# Altium footprint library ST封装.PcbLib: 1336 footprints (part 67 of 109)
Each footprint in its own frame and in the unit in brackets; x right, y up, seen from the top. Pads: shape width x height; smd on the part's side, far side on the other; paste and mask are expansions set on the pad; w line width, h text height; cw(c..) or ccw(c..) is an arc to the next point about the centre after c.
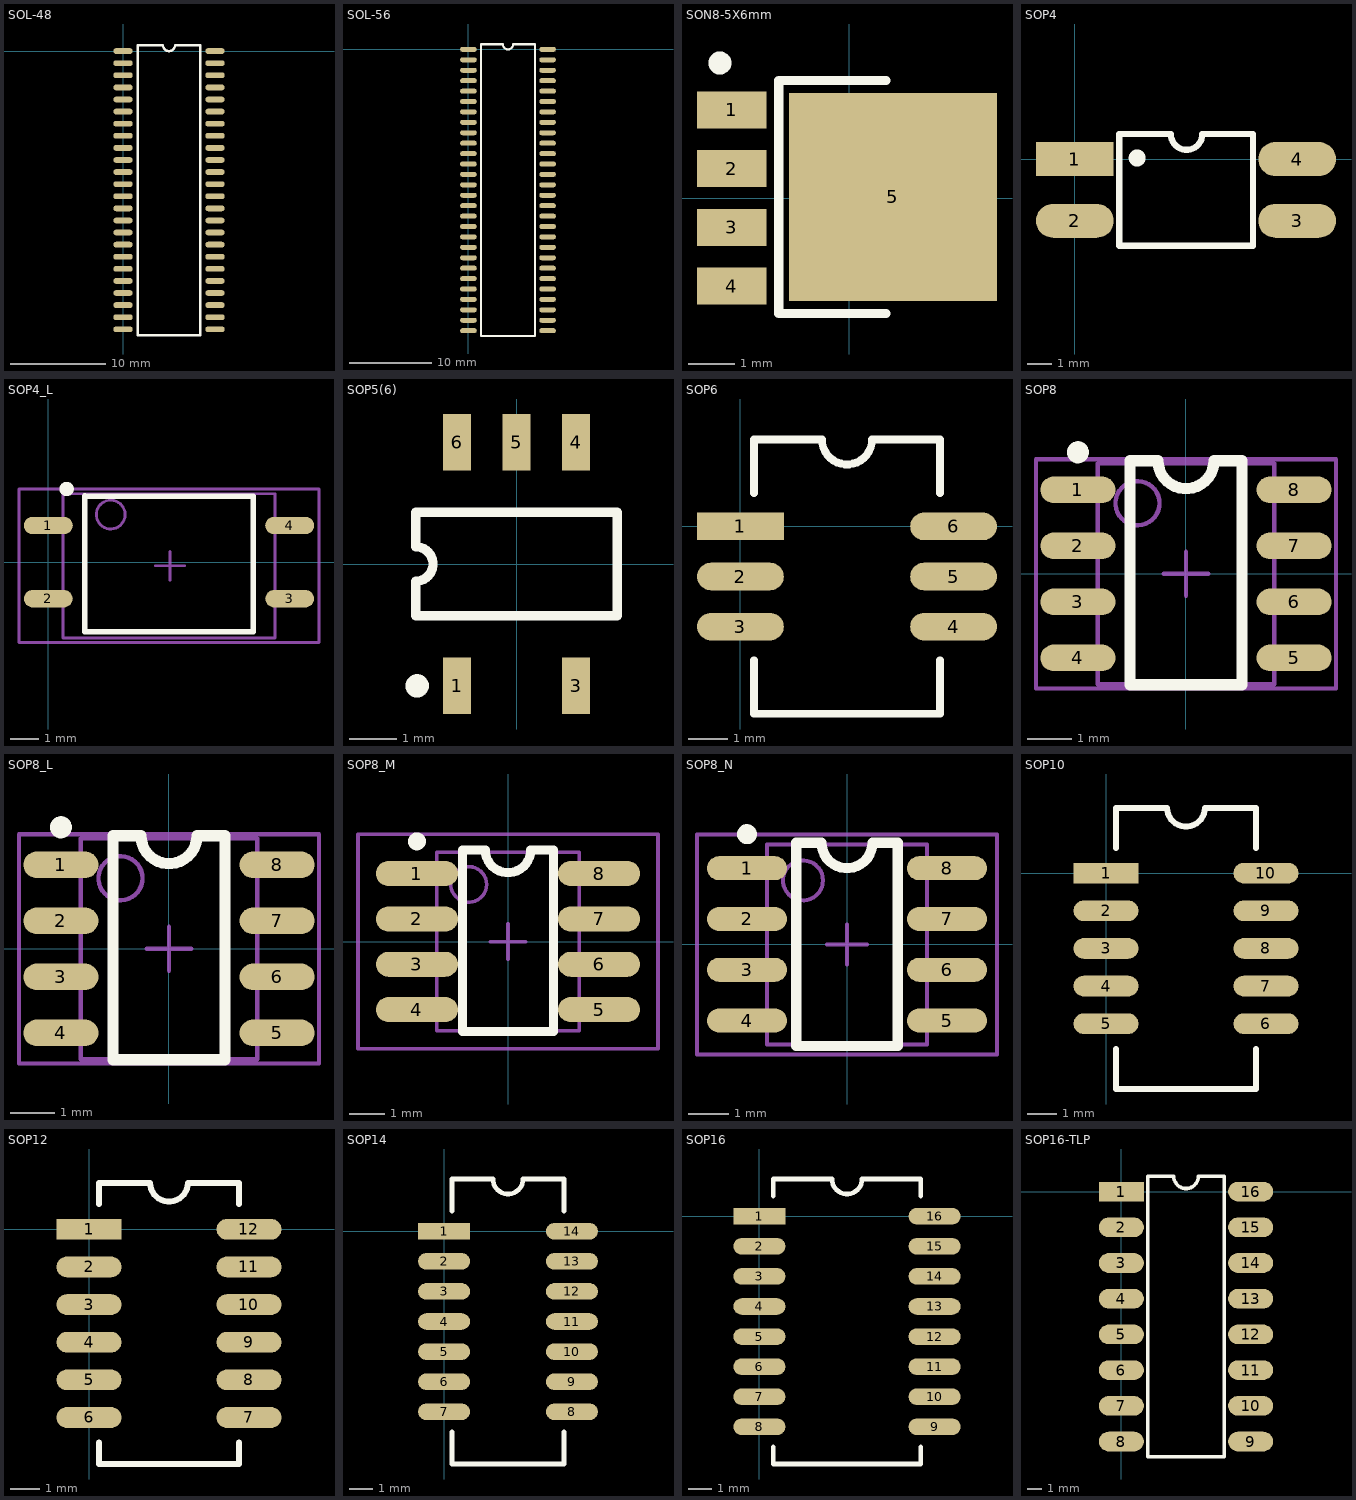
[diagram p66: the footprints below, top view; thin cyan lines are the x and y axes]

## SOL-48 [mil]
pads (48):
  oval 80x24 smd: 1(0,0) 2(0,-50) 3(0,-100) 4(0,-150) 5(0,-200) 6(0,-250) 7(0,-300) 8(0,-350) 9(0,-400) 10(0,-450) 11(0,-500) 12(0,-550) 13(0,-600) 14(0,-650) 15(0,-700) 16(0,-750) 17(0,-800) 18(0,-850) 19(0,-900) 20(0,-950) 21(0,-1000) 22(0,-1050) 23(0,-1100) 24(0,-1150) 25(380,-1150) 26(380,-1100) 27(380,-1050) 28(380,-1000) 29(380,-950) 30(380,-900) 31(380,-850) 32(380,-800) 33(380,-750) 34(380,-700) 35(380,-650) 36(380,-600) 37(380,-550) 38(380,-500) 39(380,-450) 40(380,-400) 41(380,-350) 42(380,-300) 43(380,-250) 44(380,-200) 45(380,-150) 46(380,-100) 47(380,-50) 48(380,0)
Top Overlay:
  lines w10: 60,-1175 320,-1175 320,25 215,25 cw(c190,25) 165,25 60,25 60,-1175

## SOL-56 [mil]
pads (56):
  oval 80x24 smd: 1(0,0) 2(0,-50) 3(0,-100) 4(0,-150) 5(0,-200) 6(0,-250) 7(0,-300) 8(0,-350) 9(0,-400) 10(0,-450) 11(0,-500) 12(0,-550) 13(0,-600) 14(0,-650) 15(0,-700) 16(0,-750) 17(0,-800) 18(0,-850) 19(0,-900) 20(0,-950) 21(0,-1000) 22(0,-1050) 23(0,-1100) 24(0,-1150) 25(0,-1200) 26(0,-1250) 27(0,-1300) 28(0,-1350) 29(380,-1350) 30(380,-1300) 31(380,-1250) 32(380,-1200) 33(380,-1150) 34(380,-1100) 35(380,-1050) 36(380,-1000) 37(380,-950) 38(380,-900) 39(380,-850) 40(380,-800) 41(380,-750) 42(380,-700) 43(380,-650) 44(380,-600) 45(380,-550) 46(380,-500) 47(380,-450) 48(380,-400) 49(380,-350) 50(380,-300) 51(380,-250) 52(380,-200) 53(380,-150) 54(380,-100) 55(380,-50) 56(380,0)
Top Overlay:
  lines w10: 60,-1375 60,25 165,25 ccw(c190,25) 215,25 320,25 320,-1375 60,-1375

## SON8-5X6mm [mm] "8-Pin Small Outline Integrated Circuit 1.27 mm Pitch, IPC Low Density"
height 1.75
pads (5):
  rect 1.5x0.8 smd: 1(-2.54,1.905) 2(-2.54,0.635) 3(-2.54,-0.635) 4(-2.54,-1.905)
  rect 4.5x4.5 smd: 5(0.95,0.025)
Top Overlay:
  circle w0.25: c-2.794,2.921 r0.125
  lines w0.2: 0.8,-2.5 -1.524,-2.5 -1.524,2.54 0.8,2.54
Mechanical 15:
  lines w0.1: -0.5,0 0.5,0 ; 0,-0.5 0,0.5
3D body "User Library-SON8-5x6mm.step": height 1, standoff -0.05, extent -3,-2.5 3,2.5

## SOP4 [mm]
pads (4):
  rect 3.2x1.4 smd: 1(0,0)
  oval 3.2x1.4 smd: 2(0,-2.54) 3(9.15,-2.54) 4(9.15,0)
Top Overlay:
  circle w0.4: c2.564,0.046 r0.15
  lines w0.254: 1.827,-3.57 7.327,-3.57 7.327,1.03 5.247,1.03 cw(c4.599,1.03) 3.95,1.03 1.827,1.03 1.827,-3.57
3D body "SOP-4.STEP": height 2.02, standoff -0.02, extent 1.142,-3.27 8.002,0.73

## SOP4_L [mm] "8-Pin Small Outline Integrated Circuit 1.27 mm Pitch, IPC High Density"
height 1.75
pads (4):
  oval 1.7x0.6 smd: 1(0,1.27) 2(0,-1.27) 3(8.382,-1.27) 4(8.382,1.27)
Top Overlay:
  circle w0.25: c0.637,2.54 r0.125
  lines w0.2: 1.27,2.286 7.112,2.286 7.112,-2.413 1.27,-2.413 1.27,2.3
Mechanical 13:
  circle w0.1: c2.167,1.651 r0.5
  lines w0.1: 0.508,-2.627 7.874,-2.627 7.874,2.373 0.508,2.373 0.508,-2.627
Mechanical 15:
  lines w0.1: 3.728,-0.127 4.728,-0.127 ; 4.228,-0.627 4.228,0.373 ; -1.016,-2.794 9.398,-2.794 9.398,2.54 -1.016,2.54 -1.016,-2.794
3D body "SOP-4.STEP": height 2.02, standoff -0.02, extent 0.761,-2 7.621,2

## SOP5(6) [mm] "Small Outline; 6 Leads (1 Absent); Body Width 4.4 mm; Pitch 1.27 mm"
height 2.4
pads (5):
  rect 0.6x1.2 smd: 1(-1.27,-2.6) 3(1.27,-2.6) 4(1.27,2.6) 5(0,2.6) 6(-1.27,2.6)
Top Overlay:
  circle w0.25: c-2.12,-2.6 r0.125
  lines w0.2: -2.15,-1.1 -2.15,-0.367 ccw(c-2.15,0) -2.15,0.367 -2.15,1.1 2.15,1.1 2.15,-1.1 -2.15,-1.1

## SOP6 [mm]
pads (6):
  rect 2.2x0.7 smd: 1(0,0)
  oval 2.2x0.7 smd: 2(0,-1.27) 3(0,-2.54) 4(5.4,-2.54) 5(5.4,-1.27) 6(5.4,0)
Top Overlay:
  lines w0.2: 0.34,-3.39 0.34,-4.745 5.06,-4.745 5.06,-3.39 ; 0.34,0.85 0.34,2.205 2.065,2.205 ccw(c2.7,2.205) 3.335,2.205 5.06,2.205 5.06,0.85

## SOP8 [mm]
pads (8):
  oval 1.7x0.6 smd: 1(-2.45,1.905) 2(-2.45,0.635) 3(-2.45,-0.635) 4(-2.45,-1.905) 5(2.45,-1.905) 6(2.45,-0.635) 7(2.45,0.635) 8(2.45,1.905)
Top Overlay:
  circle w0.25: c-2.45,2.755 r0.125
  lines w0.254: -1.27,-2.515 1.27,-2.515 1.27,2.565 0.635,2.565 cw(c0,2.565) -0.635,2.565 -1.27,2.565 -1.27,-2.515
Mechanical 13:
  circle w0.1: c-1.1,1.6 r0.5
  lines w0.1: -2,-2.5 -2,2.5 2,2.5 2,-2.5 -2,-2.5
Mechanical 15:
  lines w0.1: -0.5,0 0.5,0 ; 0,-0.5 0,0.5 ; -3.4,-2.6 -3.4,2.6 3.4,2.6 3.4,-2.6 -3.4,-2.6
3D body "SO-8.STEP": height 1.7, standoff 0, extent -3,-2.45 3,2.45

## SOP8_L [mm] "8-Pin Small Outline Integrated Circuit 1.27 mm Pitch, IPC High Density"
height 1.75
pads (8):
  oval 1.7x0.6 smd: 1(-2.45,1.905) 2(-2.45,0.635) 3(-2.45,-0.635) 4(-2.45,-1.905) 5(2.45,-1.905) 6(2.45,-0.635) 7(2.45,0.635) 8(2.45,1.905)
Top Overlay:
  circle w0.25: c-2.45,2.755 r0.125
  lines w0.254: -1.27,-2.515 -1.27,2.565 -0.635,2.565 ccw(c0,2.565) 0.635,2.565 1.27,2.565 1.27,-2.515 -1.27,-2.515
Mechanical 13:
  circle w0.1: c-1.1,1.6 r0.5
  lines w0.1: -2,-2.5 2,-2.5 2,2.5 -2,2.5 -2,-2.5
Mechanical 15:
  lines w0.1: -0.5,0 0.5,0 ; 0,-0.5 0,0.5 ; -3.4,-2.6 3.4,-2.6 3.4,2.6 -3.4,2.6 -3.4,-2.6
3D body "SO-8.STEP": height 1.7, standoff 0, extent -3,-2.45 3,2.45

## SOP8_M [mm] "8-Pin Small Outline Integrated Circuit 1.27 mm Pitch, IPC Low Density"
height 1.75
pads (8):
  oval 2.3x0.7 smd: 1(-2.55,1.905) 2(-2.55,0.635) 3(-2.55,-0.635) 4(-2.55,-1.905) 5(2.55,-1.905) 6(2.55,-0.635) 7(2.55,0.635) 8(2.55,1.905)
Top Overlay:
  circle w0.25: c-2.55,2.805 r0.125
  lines w0.254: -1.27,-2.515 1.27,-2.515 1.27,2.565 0.635,2.565 cw(c0,2.565) -0.635,2.565 -1.27,2.565 -1.27,-2.515
Mechanical 13:
  circle w0.1: c-1.1,1.6 r0.5
  lines w0.1: -2,-2.5 -2,2.5 2,2.5 2,-2.5 -2,-2.5
Mechanical 15:
  lines w0.1: -0.5,0 0.5,0 ; 0,-0.5 0,0.5 ; -4.2,-3 -4.2,3 4.2,3 4.2,-3 -4.2,-3
3D body "SO-8.STEP": height 1.7, standoff 0, extent -3,-2.45 3,2.45

## SOP8_N [mm] "8-Pin Small Outline Integrated Circuit 1.27 mm Pitch, IPC Medium Density"
height 1.75
pads (8):
  oval 2x0.6 smd: 1(-2.5,1.905) 2(-2.5,0.635) 3(-2.5,-0.635) 4(-2.5,-1.905) 5(2.5,-1.905) 6(2.5,-0.635) 7(2.5,0.635) 8(2.5,1.905)
Top Overlay:
  circle w0.25: c-2.5,2.755 r0.125
  lines w0.254: -1.27,-2.54 -1.27,2.54 -0.635,2.54 ccw(c0,2.54) 0.635,2.54 1.27,2.54 1.27,-2.54 -1.27,-2.54
Mechanical 13:
  circle w0.1: c-1.1,1.6 r0.5
  lines w0.1: -2,-2.5 2,-2.5 2,2.5 -2,2.5 -2,-2.5
Mechanical 15:
  lines w0.1: -0.5,0 0.5,0 ; 0,-0.5 0,0.5 ; -3.75,-2.75 3.75,-2.75 3.75,2.75 -3.75,2.75 -3.75,-2.75
3D body "SO-8.STEP": height 1.7, standoff 0, extent -3,-2.45 3,2.45

## SOP10 [mm]
pads (10):
  rect 2.2x0.7 smd: 1(0,0)
  oval 2.2x0.7 smd: 2(0,-1.27) 3(0,-2.54) 4(0,-3.81) 5(0,-5.08) 6(5.4,-5.08) 7(5.4,-3.81) 8(5.4,-2.54) 9(5.4,-1.27) 10(5.4,0)
Top Overlay:
  lines w0.2: 0.34,-5.93 0.34,-7.285 5.06,-7.285 5.06,-5.93 ; 0.34,0.85 0.34,2.205 2.065,2.205 ccw(c2.7,2.205) 3.335,2.205 5.06,2.205 5.06,0.85

## SOP12 [mm]
pads (12):
  rect 2.2x0.7 smd: 1(0,0)
  oval 2.2x0.7 smd: 2(0,-1.27) 3(0,-2.54) 4(0,-3.81) 5(0,-5.08) 6(0,-6.35) 7(5.4,-6.35) 8(5.4,-5.08) 9(5.4,-3.81) 10(5.4,-2.54) 11(5.4,-1.27) 12(5.4,0)
Top Overlay:
  lines w0.2: 0.34,-7.2 0.34,-7.92 5.06,-7.92 5.06,-7.2 ; 0.34,0.85 0.34,1.57 2.065,1.57 ccw(c2.7,1.57) 3.335,1.57 5.06,1.57 5.06,0.85

## SOP14 [mm]
pads (14):
  rect 2.2x0.7 smd: 1(0,0)
  oval 2.2x0.7 smd: 2(0,-1.27) 3(0,-2.54) 4(0,-3.81) 5(0,-5.08) 6(0,-6.35) 7(0,-7.62) 8(5.4,-7.62) 9(5.4,-6.35) 10(5.4,-5.08) 11(5.4,-3.81) 12(5.4,-2.54) 13(5.4,-1.27) 14(5.4,0)
Top Overlay:
  lines w0.2: 0.34,-8.47 0.34,-9.825 5.06,-9.825 5.06,-8.47 ; 0.34,0.85 0.34,2.205 2.065,2.205 ccw(c2.7,2.205) 3.335,2.205 5.06,2.205 5.06,0.85
3D body "SOP14.STEP": height 1.61, standoff 0, extent -0.306,-8.16 5.894,0.54

## SOP16 [mm]
pads (16):
  rect 2.2x0.7 smd: 1(0,0)
  oval 2.2x0.7 smd: 2(0,-1.27) 3(0,-2.54) 4(0,-3.81) 5(0,-5.08) 6(0,-6.35) 7(0,-7.62) 8(0,-8.89) 9(7.4,-8.89) 10(7.4,-7.62) 11(7.4,-6.35) 12(7.4,-5.08) 13(7.4,-3.81) 14(7.4,-2.54) 15(7.4,-1.27) 16(7.4,0)
Top Overlay:
  lines w0.2: 0.59,-9.74 0.59,-10.46 6.81,-10.46 6.81,-9.74 ; 0.59,0.85 0.59,1.57 3.065,1.57 ccw(c3.7,1.57) 4.335,1.57 6.81,1.57 6.81,0.85
3D body "SOP-16.STEP": height 1.5, standoff -0.1, extent 0.551,-9.318 6.816,0.682

## SOP16-TLP [mm]
pads (16):
  rect 3.2x1.4 smd: 1(0,0)
  oval 3.2x1.4 smd: 2(0,-2.54) 3(0,-5.08) 4(0,-7.62) 5(0,-10.16) 6(0,-12.7) 7(0,-15.24) 8(0,-17.78) 9(9.195,-17.78) 10(9.195,-15.24) 11(9.195,-12.7) 12(9.195,-10.16) 13(9.195,-7.62) 14(9.195,-5.08) 15(9.195,-2.54) 16(9.195,0)
Top Overlay:
  lines w0.254: 1.877,-18.87 7.324,-18.87 7.324,1.09 5.474,1.09 cw(c4.601,1.09) 3.727,1.09 1.877,1.09 1.877,-18.87